# Altium footprint library PcbLib.PcbLib: 112 footprints (part 5 of 7)
Each footprint in its own frame and in the unit in brackets; x right, y up, seen from the top. Pads: shape width x height; smd on the part's side, far side on the other; paste and mask are expansions set on the pad; w line width, h text height; cw(c..) or ccw(c..) is an arc to the next point about the centre after c.
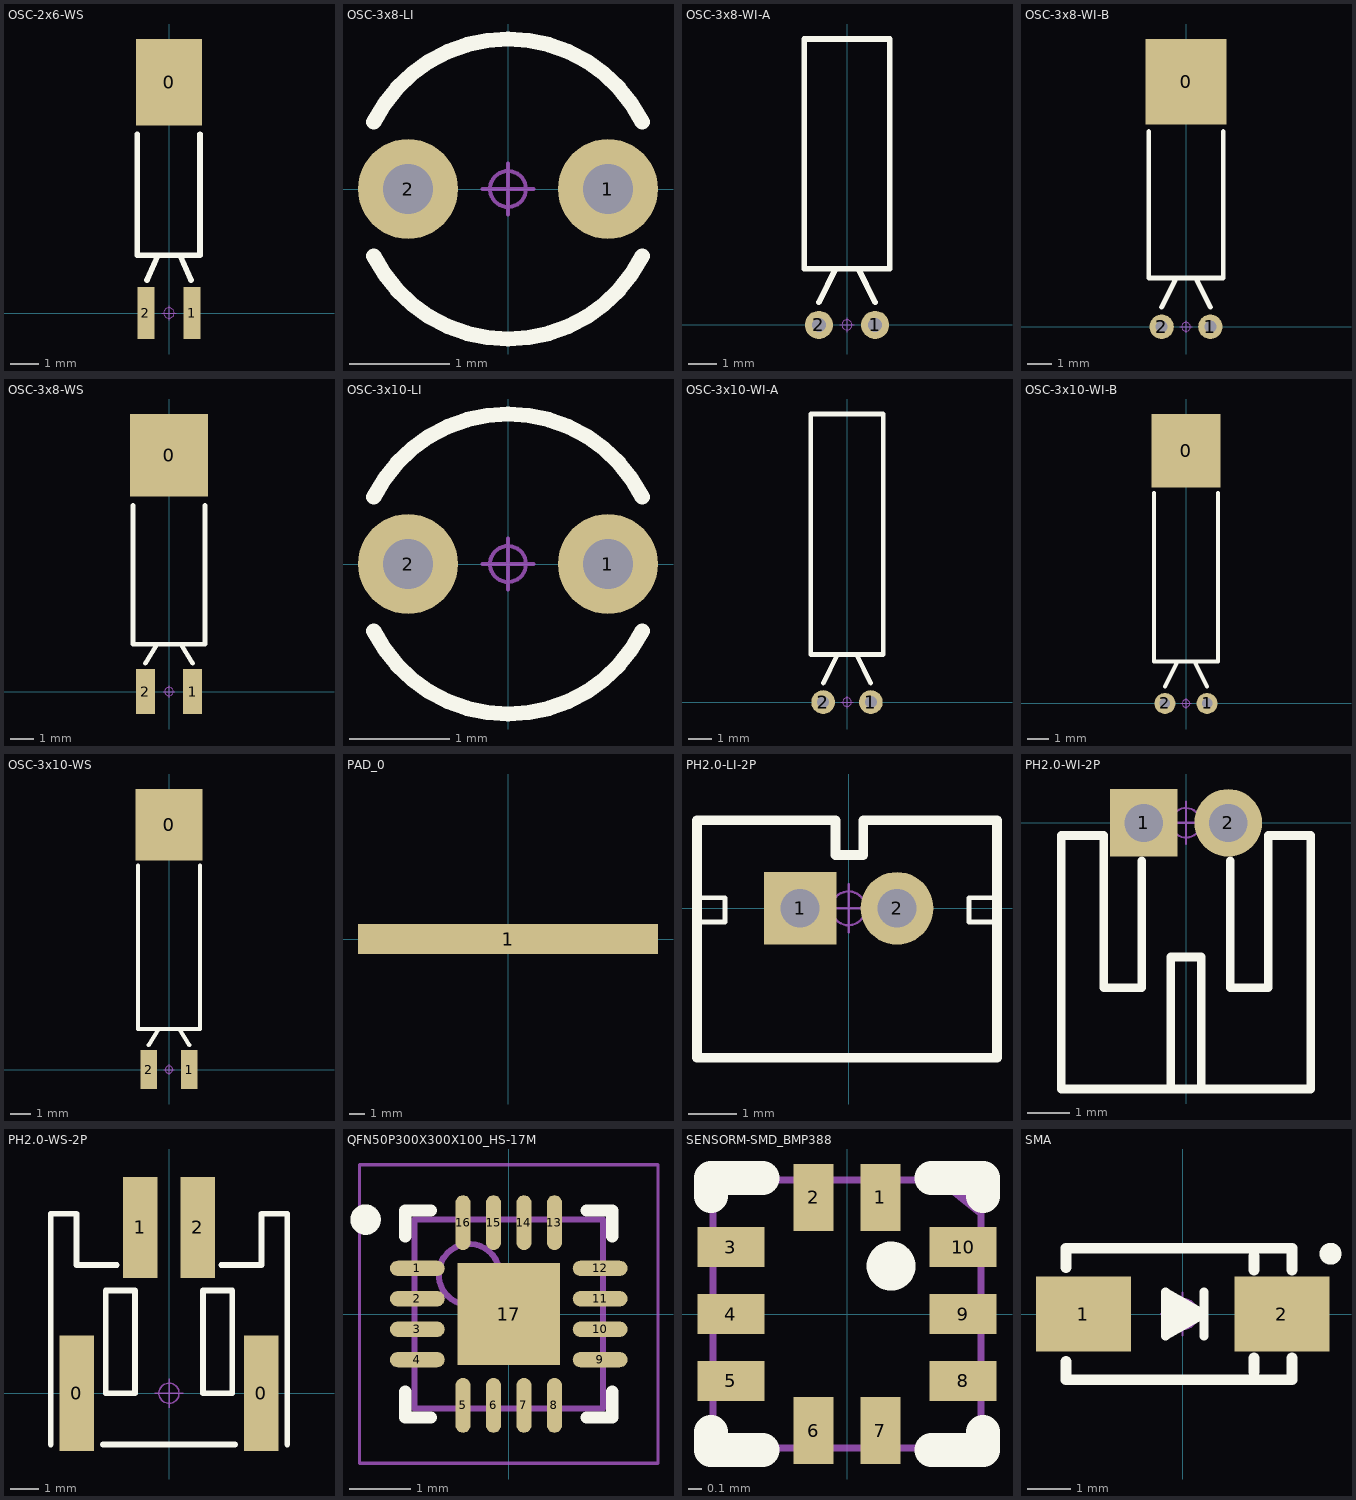
[diagram p4: the footprints below, top view; thin cyan lines are the x and y axes]

## OSC-2x6-WS [mm] "�žࣺ1.6mm"
pads (3):
  rect 2.3x3 smd: 0(0,8)
  rect 0.6x1.8 smd: 1(0.8,0) 2(-0.8,0)
Top Overlay:
  lines w0.2: -1.1,6.2 -1.1,2 1.072,2 1.072,6.2 ; -0.762,1.143 -0.381,2 ; 0.381,2 0.762,1.143
Mechanical 15:
  circle w0.04: c0,0 r0.18
  lines w0.04: -0.254,0 0.254,0 ; 0,-0.254 0,0.254
3D body "OSC-2x6-WS.STEP": height 2.01, standoff -0.04, extent -1,-0.601 1,8

## OSC-3x8-LI [mm] "�žࣺ2mm                  ��װ�������Ա���� ID���ƾ���ʯ"
pads (2):
  round 1 hole 0.5: 1(1,0) 2(-1,0)
Top Overlay:
  lines w0.152: -1.342,-0.671 ccw(c0,0) 1.342,-0.671 ; -1.342,0.671 cw(c0,0) 1.342,0.671
Mechanical 15:
  circle w0.04: c0,0 r0.18
  lines w0.04: -0.254,0 0.254,0 ; 0,-0.254 0,0.254
3D body "OSC-3x8-LI.STEP": height 9.1, standoff -2.5, extent -1.5,-1.5 1.5,1.5

## OSC-3x8-WI-A [mm] "�žࣺ2mm         ��װ�������Ա���� ID���ƾ���ʯ"
pads (2):
  round 1 hole 0.5: 1(1,0) 2(-1,0)
Top Overlay:
  lines w0.2: -1,0.8 -0.4,2 ; 0.4,2 1,0.8 ; -1.524,2 1.524,2 1.524,10.16 -1.524,10.16 -1.524,2
Mechanical 15:
  circle w0.04: c0,0 r0.18
  lines w0.04: -0.254,0 0.254,0 ; 0,-0.254 0,0.254
3D body "OSC-3x8-WI.STEP": height 3.03, standoff -2.6, extent -1.5,-0.179 1.5,10

## OSC-3x8-WI-B [mm] "�žࣺ2mm            ��װ�������Ա���� ID���ƾ���ʯ"
pads (3):
  rect 3.3x3.5 smd: 0(0,10.033)
  round 1 hole 0.5: 1(1,0) 2(-1,0)
Top Overlay:
  lines w0.2: -1.524,8.001 -1.524,2 1.524,2 1.524,8.001 ; -1,0.8 -0.4,2 ; 0.4,2 1,0.8
Mechanical 15:
  circle w0.04: c0,0 r0.18
  lines w0.04: -0.254,0 0.254,0 ; 0,-0.254 0,0.254
3D body "OSC-3x8-WI.STEP": height 3.03, standoff -2.6, extent -1.5,-0.179 1.5,10

## OSC-3x8-WS [mm] "�žࣺ2mm    ��װ�������Ա���� ID���ƾ���ʯ"
pads (3):
  rect 3.3x3.5 smd: 0(0,10)
  rect 0.8x1.9 smd: 1(1,0) 2(-1,0)
Top Overlay:
  lines w0.2: -1.524,7.874 -1.524,2 1.524,2 1.524,7.874 ; -1,1.2 -0.5,2 ; 0.5,2 1,1.2
Mechanical 15:
  circle w0.04: c0,0 r0.18
  lines w0.04: -0.254,0 0.254,0 ; 0,-0.254 0,0.254
3D body "OSC-3x8-WS.STEP": height 3.03, standoff 0, extent -1.5,-0.501 1.5,10

## OSC-3x10-LI [mm] "�žࣺ2mm"
pads (2):
  round 1 hole 0.5: 1(1,0) 2(-1,0)
Top Overlay:
  lines w0.152: -1.342,-0.671 ccw(c0,0) 1.342,-0.671 ; -1.342,0.671 cw(c0,0) 1.342,0.671
Mechanical 15:
  circle w0.04: c0,0 r0.18
  lines w0.04: -0.254,0 0.254,0 ; 0,-0.254 0,0.254
3D body "OSC-3x10-LI.STEP": height 11.1, standoff -2.5, extent -1.5,-1.5 1.5,1.5

## OSC-3x10-WI-A [mm] "�žࣺ2mm"
pads (2):
  round 1 hole 0.5: 1(1,0) 2(-1,0)
Top Overlay:
  lines w0.2: -1,0.8 -0.4,2 ; 0.4,2 1,0.8 ; -1.524,2 -1.524,12.1 1.524,12.1 1.524,2 -1.524,2
Mechanical 15:
  circle w0.04: c0,0 r0.18
  lines w0.04: -0.254,0 0.254,0 ; 0,-0.254 0,0.254
3D body "OSC-3x10-WI.STEP": height 3.03, standoff -2.6, extent -1.5,-0.179 1.5,12

## OSC-3x10-WI-B [mm] "�žࣺ2mm"
pads (3):
  rect 3.3x3.5 smd: 0(0,12)
  round 1 hole 0.5: 1(1,0) 2(-1,0)
Top Overlay:
  lines w0.2: -1.524,10 -1.524,2 1.524,2 1.524,10 ; -1,0.8 -0.4,2 ; 0.4,2 1,0.8
Mechanical 15:
  circle w0.04: c0,0 r0.18
  lines w0.04: -0.254,0 0.254,0 ; 0,-0.254 0,0.254
3D body "OSC-3x10-WI.STEP": height 3.03, standoff -2.6, extent -1.5,-0.179 1.5,12

## OSC-3x10-WS [mm] "�žࣺ2mm"
pads (3):
  rect 3.3x3.5 smd: 0(0,12)
  rect 0.8x1.9 smd: 1(1,0) 2(-1,0)
Top Overlay:
  lines w0.2: -1.524,10 -1.524,2 1.524,2 1.524,10 ; -1,1.2 -0.5,2 ; 0.5,2 1,1.2
Mechanical 15:
  circle w0.04: c0,0 r0.18
  lines w0.04: -0.254,0 0.254,0 ; 0,-0.254 0,0.254
3D body "OSC-3x10-WS.STEP": height 3.03, standoff 0, extent -1.5,-0.501 1.5,12

## PAD_0 [mm]
pads (1):
  rect 20x2 smd: 1(0,0)

## PH2.0-LI-2P [mm]
height 10
pads (2):
  rect 1.5x1.5 hole 0.8: 1(-1,0)
  round 1.5 hole 0.8: 2(1,0)
Top Overlay:
  lines w0.1: -3.128,-0.284 -2.548,-0.284 -2.548,0.216 -3.128,0.216 ; 3.064,-0.284 2.484,-0.284 2.484,0.216 3.064,0.216
  lines w0.2: -3.128,-3.084 -3.128,1.816 ; -0.27,1.816 -0.27,1.1 0.302,1.1 0.302,1.816 ; 3.064,-3.084 3.064,1.816
  lines w0.203: -3.128,-3.084 3,-3.084 ; -3.128,1.816 -0.27,1.816 ; 0.302,1.816 3,1.816
Mechanical 15:
  circle w0.05: c0,0 r0.35
  lines w0.05: -0.5,0 0.5,0 ; 0,-0.5 0,0.5
3D body "PH2.0-LI-2P.STEP": height 6.01, standoff -2.99, extent -2.95,-3 2.95,1.7

## PH2.0-WI-2P [mm]
height 10
pads (2):
  rect 1.6x1.6 hole 0.9: 1(-1,0)
  round 1.6 hole 0.9: 2(1,0)
Top Overlay:
  lines w0.203: -1.05,-0.9 -1.05,-3.9 -1.95,-3.9 -1.95,-3.3 -1.95,-0.3 -2,-0.3 -2.95,-0.3 -2.95,-6.3 2.95,-6.3 2.95,-0.3 2,-0.3 1.95,-0.3 1.95,-3.3 1.95,-3.9 1.05,-3.9 1.05,-0.9 ; -0.365,-6.215 -0.365,-3.175 0.365,-3.175 0.365,-6.215
Mechanical 15:
  circle w0.05: c0,0 r0.35
  lines w0.05: -0.5,0 0.5,0 ; 0,-0.5 0,0.5
3D body "PH2.0-WI-2P.STEP": height 4.75, standoff -2.65, extent -2.95,-6.3 2.95,0.3

## PH2.0-WS-2P [mm]
pads (4):
  rect 1.2x4 smd: 0(-3.2,-0.006) 0(3.2,-0.006)
  rect 1.2x3.5 smd: 1(-1,5.744) 2(1,5.744)
Top Overlay:
  lines w0.2: -4.096,-1.778 -4.096,6.223 -3.207,6.223 -3.207,4.445 -1.81,4.445 ; -2.286,-1.778 2.286,-1.778 ; 1.81,4.445 3.207,4.445 3.207,6.223 4.096,6.223 4.096,-1.778 ; -2.191,0 -2.191,3.556 -1.175,3.556 -1.175,0 -2.191,0 ; 1.175,0 1.175,3.556 2.191,3.556 2.191,0 1.175,0
Mechanical 15:
  circle w0.05: c0,0 r0.35
  lines w0.05: -0.5,0 0.5,0 ; 0,-0.5 0,0.5
3D body "PH2.0 SMD-W-2P.STEP": height 5.55, standoff 0.05, extent -4,-1.65 4,6.95

## QFN50P300X300X100_HS-17M [mm] "QFN, 16-Leads, Body 3.00x3.00mm, Pitch 0.50mm, Thermal Pad 1.68x1.68mm, IPC Low Density"
height 1
pads (17):
  oval 0.9x0.25 smd: 1(-1.5,0.75) 2(-1.5,0.25) 3(-1.5,-0.25) 4(-1.5,-0.75) 9(1.5,-0.75) 10(1.5,-0.25) 11(1.5,0.25) 12(1.5,0.75)
  oval 0.25x0.9 smd: 5(-0.75,-1.5) 6(-0.25,-1.5) 7(0.25,-1.5) 8(0.75,-1.5) 13(0.75,1.5) 14(0.25,1.5) 15(-0.25,1.5) 16(-0.75,1.5)
  rect 1.68x1.68 smd: 17(0,0)
Top Overlay:
  circle w0.25: c-2.35,1.55 r0.125
  lines w0.2: -1.7,-1.275 -1.7,-1.7 -1.275,-1.7 ; -1.7,1.275 -1.7,1.7 -1.275,1.7 ; 1.275,-1.7 1.7,-1.7 1.7,-1.275 ; 1.275,1.7 1.7,1.7 1.7,1.275
Mechanical 13:
  circle w0.1: c-0.65,0.65 r0.5
  lines w0.1: -1.55,-1.55 1.55,-1.55 1.55,1.55 -1.55,1.55 -1.55,-1.55
Mechanical 15:
  lines w0.05: -2.45,-2.45 2.45,-2.45 2.45,2.45 -2.45,2.45 -2.45,-2.45
  lines w0.1: -0.5,0 0.5,0 ; 0,-0.5 0,0.5
3D body "QFN50P300X300X100_HS-17M.step": height 1, standoff 0, extent -1.56,-1.56 1.56,1.56

## SENSORM-SMD_BMP388 [mm]
pads (10):
  rect 0.3x0.5 smd mask+0.05: 1(0.249,0.871) 2(-0.249,0.871) 6(-0.249,-0.871) 7(0.249,-0.871)
  rect 0.5x0.3 smd mask+0.05: 3(-0.869,0.5) 4(-0.869,0) 5(-0.869,-0.5) 8(0.869,-0.5) 9(0.869,0) 10(0.869,0.5)
Top Overlay:
  circle w0.254: c0.33,0.358 r0.056
  lines w0.254: -1.016,-0.881 -1.016,-1.016 -0.63,-1.016 ; -1.016,0.881 -1.016,1.016 -0.63,1.016 ; 0.63,-1.016 1.016,-1.016 1.016,-0.881 ; 0.63,1.016 1.016,1.016 1.016,0.881
Mechanical 6:
  region: 0.655,0.996 1.001,0.721 1.001,0.996
Mechanical 15:
  region: 0.899,0.625 0.899,0.376 0.625,0.376 0.625,0.625
  region: 0.899,0.122 0.899,-0.127 0.625,-0.127 0.625,0.122
  region: 0.899,-0.381 0.899,-0.63 0.625,-0.63 0.625,-0.381
  region: 0.376,-0.899 0.124,-0.899 0.124,-0.625 0.376,-0.625
  region: -0.124,-0.899 -0.376,-0.899 -0.376,-0.625 -0.124,-0.625
  region: -0.897,-0.635 -0.897,-0.386 -0.622,-0.386 -0.622,-0.635
  region: -0.897,-0.127 -0.897,0.122 -0.622,0.122 -0.622,-0.127
  region: -0.622,0.622 -0.622,0.373 -0.897,0.373 -0.897,0.622
  region: -0.376,0.899 -0.124,0.899 -0.124,0.625 -0.376,0.625
  region: 0.124,0.899 0.376,0.899 0.376,0.625 0.124,0.625
  region: 1.062,1.001 1.062,1.026 1.026,1.062 0.976,1.062 0.94,1.026 0.94,1.001 0.94,0.976 0.976,0.94 1.026,0.94 1.062,0.976
  lines w0.051: -1.001,-1.001 1.001,-1.001 1.001,1.001 -1.001,1.001 -1.001,-1.001

## SMA [mm] "4.5x2.6*2.2mm������ߣ����������ţ�"
height 2.54
pads (2):
  rect 2.2x1.75 smd: 1(-2.3,0) 2(2.3,0)
Top Overlay:
  circle w0.254: c3.429,1.397 r0.127
  lines w0.203: 0.494,-0.508 0.494,0.508 ; -0.395,-0.508 -0.395,0.508 0.494,0 -0.395,-0.508
  lines w0.254: -2.7,-1.105 -2.7,-1.524 2.54,-1.524 2.54,-1.016 ; -2.7,1.08 -2.7,1.524 2.54,1.524 2.54,1.016 ; -0.33,0.305 0.305,0 -0.254,-0.305 -0.254,0.051 0.023,0 ; 1.651,-1.35 1.651,-1.016 ; 1.651,1.016 1.651,1.35
Mechanical 15:
  circle w0.05: c0,0 r0.35
  lines w0.05: -0.5,0 0.5,0 ; 0,-0.5 0,0.5
3D body "SMA.STEP": height 2.15, standoff 0.04, extent -2.528,-1.3 2.575,1.3